# Altium footprint library HW_HOLLAND_NCDM_MONITOR_R1.PcbLib: 472 footprints (part 11 of 30)
Each footprint in its own frame and in the unit in brackets; x right, y up, seen from the top. Pads: shape width x height; smd on the part's side, far side on the other; paste and mask are expansions set on the pad; w line width, h text height; cw(c..) or ccw(c..) is an arc to the next point about the centre after c.
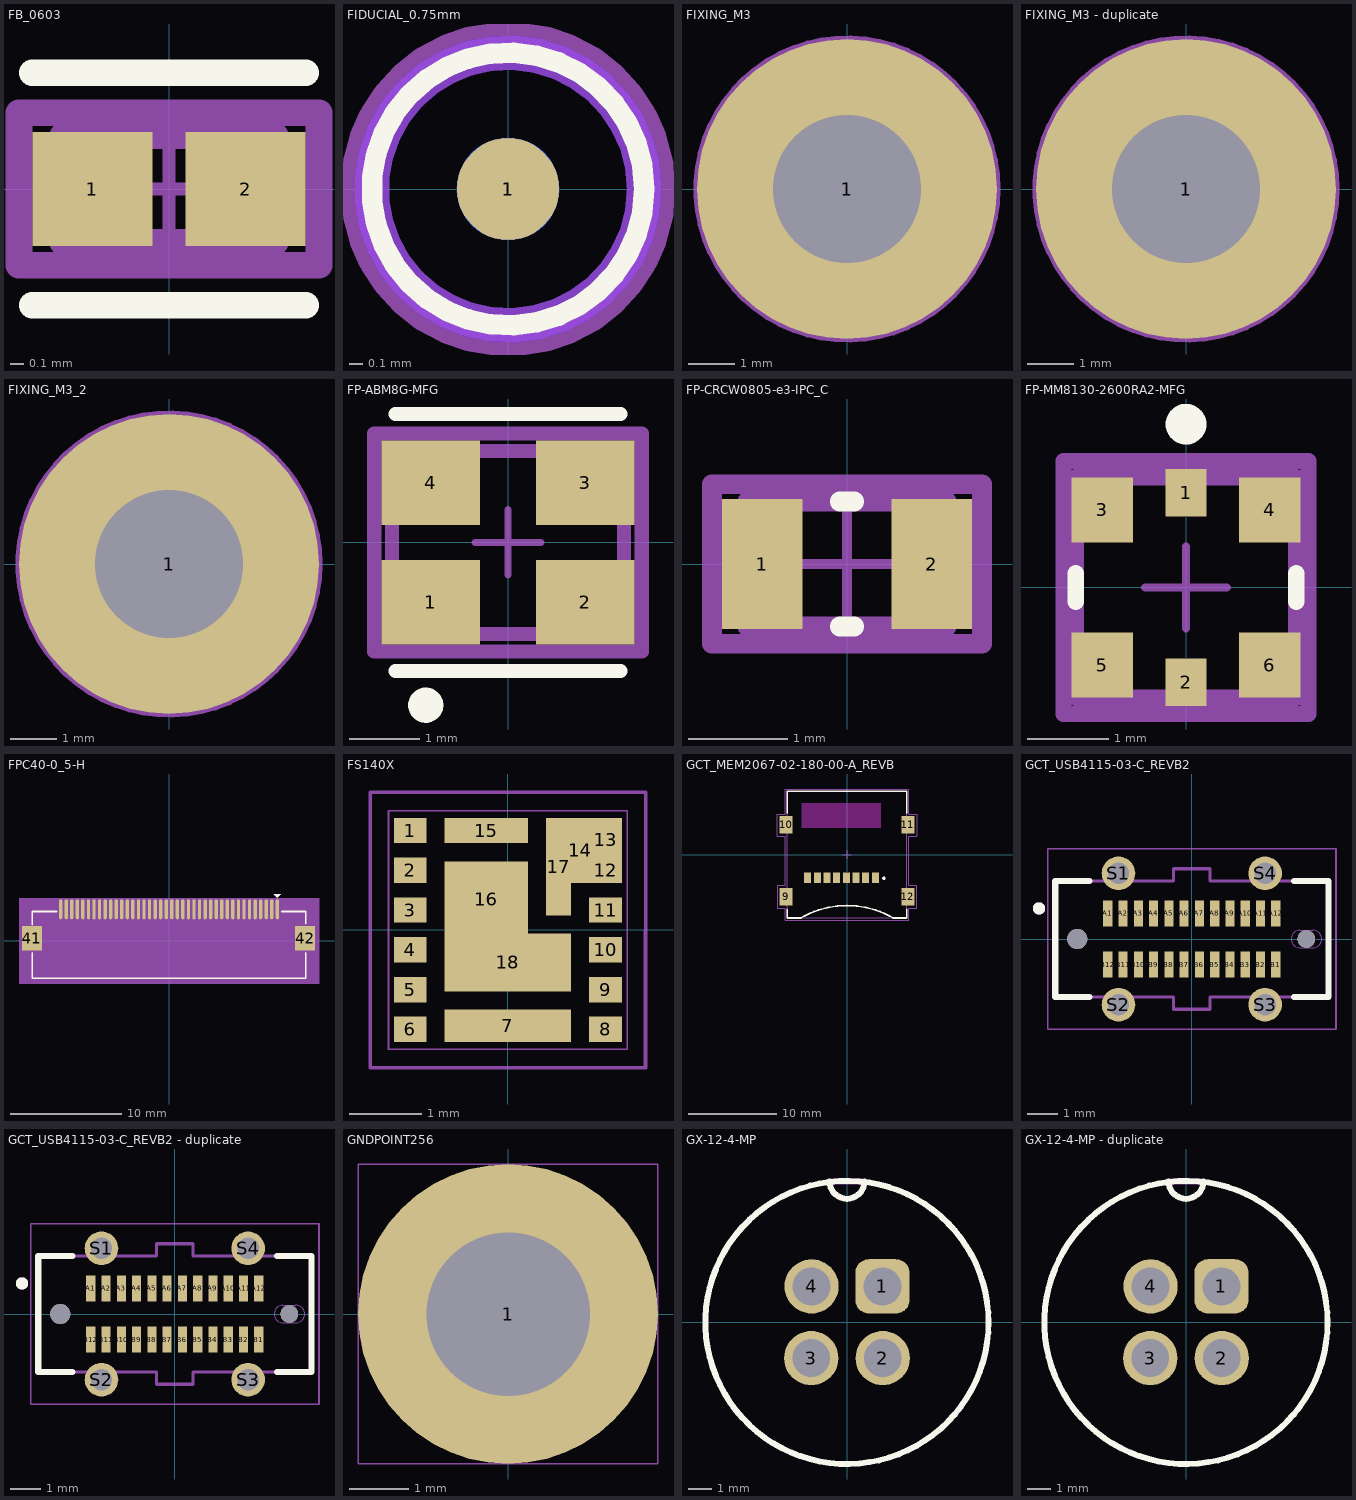
[diagram p10: the footprints below, top view; thin cyan lines are the x and y axes]

## FB_0603 [mm]
pads (2):
  rect 0.906x0.858 smd paste+0 mask+0: 1(-0.576,0) 2(0.576,0)
Top Overlay:
  lines w0.2: -1.029,-0.875 1.029,-0.875 ; -1.029,0.875 1.029,0.875
Top Courtyard:
  lines w0.2: -1.129,-0.575 1.129,-0.575 1.129,0.575 -1.129,0.575 -1.129,-0.575
  text ".Designator" at 0,0.235 h1.25
Mechanical 12:
  lines w0.2: -0.8,-0.4 0.8,-0.4 0.8,0.4 -0.8,0.4 -0.8,-0.4
Mechanical 15:
  lines w0.1: -0.5,0 0.5,0 ; 0,-0.5 0,0.5
  lines w0.2: -1.129,-0.575 1.129,-0.575 1.129,0.575 -1.129,0.575 -1.129,-0.575
3D body "FBead_Murata_BLM18SG331TN1D_eec.STEP": height 0.25, standoff 0, extent -1.129,-0.575 1.129,0.575

## FIDUCIAL_0.75mm [mm]
height 0.52
pads (2):
  round 0.75 smd mask+0.75: 1(0,0)
  round 0.75 smd far side mask+0.75: 1(0,0)
Top Layer keep-out:
  circle w0.254: c0,0 r1
Bottom Layer keep-out:
  circle w0.254: c0,0 r1
Top Overlay:
  circle w0.15: c0,0 r1
Bottom Overlay:
  circle w0.15: c0,0 r1
Top Designator:
  circle w0.254: c0,0 r1.1
  text ".Designator" at -3.809,-0.254 h0.76

## FIXING_M3 [mm]
height 0.52
pads (1):
  round 6.5 hole 3.2: 1(0,0)
Top Designator:
  circle w0.254: c0,0 r3.2
  text ".Designator" at -5.078,-0.339 h1.02

## FIXING_M3 - duplicate [mm]
height 0.52
pads (1):
  round 6.5 hole 3.2: 1(0,0)
Top Designator:
  circle w0.254: c0,0 r3.2
  text ".Designator" at -5.078,-0.339 h1.02

## FIXING_M3_2 [mm]
pads (1):
  round 6.5 hole 3.2: 1(0,0)
Top Designator:
  circle w0.254: c0,0 r3.2
  text ".Designator" at -5.078,-0.339 h1.02

## FP-ABM8G-MFG [mm]
height 1.1
pads (4):
  rect 1.4x1.2 smd paste+0 mask+0: 1(-1.1,-0.85) 2(1.1,-0.85) 3(1.1,0.85) 4(-1.1,0.85)
Top Overlay:
  circle w0.25: c-1.168,-2.311 r0.125
  lines w0.2: -1.6,-1.825 1.6,-1.825 ; -1.6,1.825 1.6,1.825
Top Assembly:
  lines w0.2: -1.9,-1.55 -1.9,1.55 1.9,1.55 1.9,-1.55 -1.9,-1.55
  text ".Designator" at 0,0.143 h0.76
Top 3D Body:
  lines w0.2: -1.65,-1.3 -1.65,1.3 1.65,1.3 1.65,-1.3 -1.65,-1.3
Top Component Center:
  lines w0.1: -0.465,0 0.465,0 ; 0,-0.465 0,0.465
Top Courtyard:
  lines w0.2: -1.9,-1.55 -1.9,1.55 1.9,1.55 1.9,-1.55 -1.9,-1.55
3D body "Crys_Abracon_ABM8G-25_000MHz-B4Y-T_eec.STEP": height 0.25, standoff 0, extent -1.9,-1.55 1.9,1.55

## FP-CRCW0805-e3-IPC_C [mil]
pads (2):
  rect 31.75x51.5 smd paste+0 mask+0: 1(-33.5,0) 2(33.5,0)
Top Overlay:
  lines w7.87: -2.86,-24.61 2.86,-24.61 ; -2.86,24.61 2.86,24.61
Top Assembly:
  lines w7.87: -53.31,-31.5 53.31,-31.5 53.31,31.5 -53.31,31.5 -53.31,-31.5
  text ".Designator" at 0,7.4 h39.37
Top 3D Body:
  lines w7.87: -39.37,-24.61 39.37,-24.61 39.37,24.61 -39.37,24.61 -39.37,-24.61
Top Component Center:
  lines w3.94: -19.68,0 19.68,0 ; 0,-19.68 0,19.68
Top Courtyard:
  lines w7.87: -53.31,-31.5 53.31,-31.5 53.31,31.5 -53.31,31.5 -53.31,-31.5
3D body "Res_Vishay_CRCW0805100KFKEA_eec.STEP": height 10, standoff 0, extent -53.31,-31.5 53.31,31.5

## FP-MM8130-2600RA2-MFG [mm]
pads (6):
  rect 0.5x0.58 smd paste-1000 mask+0: 1(0,1.16) 2(0,-1.16)
  rect 0.75x0.8 smd paste-1000 mask+0: 3(-1.025,0.95) 4(1.025,0.95) 5(-1.025,-0.95) 6(1.025,-0.95)
Top Overlay:
  circle w0.25: c0,2 r0.125
  lines w0.2: -1.35,-0.175 -1.35,0.175 ; 1.35,-0.175 1.35,0.175
Top Paste:
  rectangle: 0.65,-1.35 1.24,-0.55
  rectangle: -1.24,-1.35 -0.65,-0.55
  rectangle: 0.65,0.55 1.24,1.35
  rectangle: -1.24,0.55 -0.65,1.35
  rectangle: -0.139,-1.35 0.141,-1.07
  rectangle: -0.139,1.07 0.141,1.35
Top Assembly:
  lines w0.2: -1.5,-1.55 -1.5,1.55 1.5,1.55 1.5,-1.55 -1.5,-1.55
  text ".Designator" at 1.796,1.25 h0.8
Top 3D Body:
  lines w0.2: -1.35,-1.35 -1.35,1.35 1.35,1.35 1.35,-1.35 -1.35,-1.35
Top Component Center:
  lines w0.1: -0.5,0 0.5,0 ; 0,-0.5 0,0.5
Top Courtyard:
  lines w0.2: -1.5,-1.55 -1.5,1.55 1.5,1.55 1.5,-1.55 -1.5,-1.55
3D body "Conn_Murata_MM8130-2600RA2_eec.STEP": height 1.5, standoff 0, extent -1.25,-1.25 1.25,1.26

## FPC40-0_5-H [mm]
pads (42):
  oval 0.3x1.8 smd: 1(9.75,2.85) 2(9.25,2.85) 3(8.75,2.85) 4(8.25,2.85) 5(7.75,2.85) 6(7.25,2.85) 7(6.75,2.85) 8(6.25,2.85) 9(5.75,2.85) 10(5.25,2.85) 11(4.75,2.85) 12(4.25,2.85) 13(3.75,2.85) 14(3.25,2.85) 15(2.75,2.85) 16(2.25,2.85) 17(1.75,2.85) 18(1.25,2.85) 19(0.75,2.85) 20(0.25,2.85) 21(-0.25,2.85) 22(-0.75,2.85) 23(-1.25,2.85) 24(-1.75,2.85) 25(-2.25,2.85) 26(-2.75,2.85) 27(-3.25,2.85) 28(-3.75,2.85) 29(-4.25,2.85) 30(-4.75,2.85) 31(-5.25,2.85) 32(-5.75,2.85) 33(-6.25,2.85) 34(-6.75,2.85) 35(-7.25,2.85) 36(-7.75,2.85) 37(-8.25,2.85) 38(-8.75,2.85) 39(-9.25,2.85) 40(-9.75,2.85)
  rect 1.8x2.2 smd: 41(-12.35,0.229) 42(12.25,0.229)
Top Overlay:
  dashed: 9.449,4.201 10.049,4.201 9.749,3.901
  lines w0.152: -12.3,-1.05 -12.3,-3.35 12.3,-3.35 12.3,-1.05 ; -12.3,1.45 -12.3,2.65 -10.09,2.65 ; 10.15,2.65 12.3,2.65 12.3,1.55
  text ".Designator" at 0.635,0.212 h0.64
Top Assembly:
  dashed: 9.449,4.201 10.049,4.201 9.749,3.901
  lines w0.025: -12.294,-1.036 -12.294,-3.347 12.294,-3.347 12.294,-1.036 ; -12.294,1.428 -12.294,2.647 -10.084,2.647 ; 10.135,2.647 12.294,2.647 12.294,1.53
Top 3D Body:
  region: -13.5,3.85 13.5,3.85 13.5,-3.85 -13.5,-3.85
Mechanical 17:
  text "33" at -6.25,6.101 h2.03
  text "36" at -7.75,6.101 h2.03
  text "27" at -3.25,6.101 h2.03
  text "34" at -6.75,6.101 h2.03
  text "28" at -3.75,6.101 h2.03
  text "15" at 2.75,6.101 h2.03
  text "11" at 4.75,6.101 h2.03
  text "20" at 0.25,6.101 h2.03
  text "21" at -0.25,6.101 h2.03
  text "12" at 4.25,6.101 h2.03
  text "18" at 1.25,6.101 h2.03
  text "14" at 3.25,6.101 h2.03
  text "17" at 1.75,6.101 h2.03
  text "9" at 5.75,4.476 h2.03
  text "8" at 6.25,4.476 h2.03
  text "32" at -5.75,6.101 h2.03
  text "1" at 9.75,4.476 h2.03
  text "35" at -7.25,6.101 h2.03
  text "37" at -8.25,6.101 h2.03
  text "38" at -8.75,6.101 h2.03
  text "39" at -9.25,6.101 h2.03
  text "40" at -9.75,6.101 h2.03
  text "4" at 8.25,4.476 h2.03
  text "5" at 7.75,4.476 h2.03
  text "6" at 7.25,4.476 h2.03
  text "23" at -1.25,6.101 h2.03
  text "24" at -1.75,6.101 h2.03
  text "26" at -2.75,6.101 h2.03
  text "29" at -4.25,6.101 h2.03
  text "31" at -5.25,6.101 h2.03
  text "42" at 12.25,3.481 h2.03
  text "7" at 6.75,4.476 h2.03
  text "10" at 5.25,6.101 h2.03
  text "13" at 3.75,6.101 h2.03
  text "16" at 2.25,6.101 h2.03
  text "22" at -0.75,6.101 h2.03
  text "25" at -2.25,6.101 h2.03
  text "19" at 0.75,6.101 h2.03
  text "30" at -4.75,6.101 h2.03
  text "41" at -12.35,3.481 h2.03
  text "3" at 8.75,4.476 h2.03
  text "2" at 9.25,4.476 h2.03
3D body: height 3.81, standoff 0, extent -13.5,-3.85 13.5,3.85

## FS140X [mm]
pads (18):
  rect 0.45x0.35 smd: 1(-1.35,1.375) 2(-1.35,0.825) 3(-1.35,0.275) 4(-1.35,-0.275) 5(-1.35,-0.825) 6(-1.35,-1.375) 8(1.35,-1.375) 9(1.35,-0.825) 10(1.35,-0.275) 11(1.35,0.275) 12(1.35,0.825)
  rect 1.75x0.45 smd: 7(0,-1.325)
  rect 0.45x0.6 smd: 13(1.35,1.25)
  rect 0.35x0.9 smd: 14(1,1.1)
  rect 1.15x0.35 smd: 15(-0.3,1.375)
  rect 1.15x1.05 smd: 16(-0.3,0.425)
  rect 0.35x1.35 smd: 17(0.7,0.875)
  rect 1.75x0.8 smd: 18(0,-0.45)
Mechanical 13:
  lines w0.025: -1.65,-1.65 1.65,-1.65 1.65,1.65 -1.65,1.65 -1.65,-1.65
Mechanical 15:
  lines w0.05: -1.904,-1.904 -1.904,1.904 1.906,1.904 1.904,-1.904 -1.904,-1.904
3D body "FS1403-3300-AL.stp": height 1.42, standoff -0.03, extent -1.652,-1.65 1.648,1.65

## GCT_MEM2067-02-180-00-A_REVB [mm]
pads (12):
  rect 0.8x1.2 smd: 1(3.225,-2.625) 2(2.125,-2.625) 3(1.025,-2.625) 4(-0.075,-2.625) 5(-1.175,-2.625) 6(-2.275,-2.625) 7(-3.375,-2.625) 8(-4.475,-2.625)
  rect 1.5x2 smd: 9(-6.945,-4.825) 10(-6.945,3.375) 11(6.945,3.375) 12(6.945,-4.825)
Top Overlay:
  circle w0.2: c4.2,-2.7 r0.1
  lines w0.2: -6.8,-6.275 -6.8,-7.225 -5.25,-7.225 ; -6.8,4.725 -6.8,7.225 6.8,7.225 6.8,4.725 ; -5.226,-7.211 cw(c0,-16.264) 5.226,-7.211 ; 5.25,-7.225 6.8,-7.225 6.8,-6.275
Keep-Out Layer:
  region: 3.85,3.028 -5.155,3.028 -5.155,5.825 3.85,5.825
Mechanical 13:
  lines w0.1: -6.8,2.77 -7.3,2.77 -7.3,3.97 -6.8,3.97 ; -0.5,0 0.5,0 ; 0,-0.5 0,0.5 ; -6.8,-5.4 -7.3,-5.4 -7.3,-4.2 -6.8,-4.2 ; -6.8,-5.4 -6.8,-4.2 ; -6.8,-5.4 -6.8,-7.225 6.8,-7.225 6.8,-5.4 ; -6.8,-4.2 -6.8,7.225 6.8,7.225 6.8,3.97 ; 6.8,-5.4 6.8,-4.2 ; 6.8,-5.4 7.3,-5.4 7.3,-4.2 6.8,-4.2 ; 6.8,-4.2 6.8,2.77 ; 6.8,2.77 6.8,3.97 ; 6.8,2.77 7.3,2.77 7.3,3.97 6.8,3.97
Mechanical 15:
  lines w0.05: -7.95,-6.096 -7.061,-6.096 -7.061,-7.468 7.061,-7.468 7.061,-6.096 7.95,-6.096 7.95,-3.505 7.061,-3.505 7.061,2.108 7.95,2.108 7.95,4.597 7.061,4.597 7.061,7.468 -7.061,7.468 -7.061,4.597 -7.95,4.597 -7.95,2.108 -7.061,2.108 -7.061,-3.505 -7.95,-3.505 -7.95,-6.096
3D body "MEM2067-02-180-00-A--3DModel-STEP-56544.STEP": height 1.8, standoff 0, extent -7.427,-7.225 7.173,7.225

## GCT_USB4115-03-C_REVB2 [mm]
pads (30):
  rect 0.3x0.85 smd: A1(-2.75,0.835) A2(-2.25,0.835) A3(-1.75,0.835) A4(-1.25,0.835) A5(-0.75,0.835) A6(-0.25,0.835) A7(0.25,0.835) A8(0.75,0.835) A9(1.25,0.835) A10(1.75,0.835) A11(2.25,0.835) A12(2.75,0.835) B1(2.75,-0.835) B2(2.25,-0.835) B3(1.75,-0.835) B4(1.25,-0.835) B5(0.75,-0.835) B6(0.25,-0.835) B7(-0.25,-0.835) B8(-0.75,-0.835) B9(-1.25,-0.835) B10(-1.75,-0.835) B11(-2.25,-0.835) B12(-2.75,-0.835)
  round 1.1 hole 0.7: S1(-2.4,2.15) S2(-2.4,-2.15) S3(2.4,-2.15) S4(2.4,2.15)
  round 0.66 hole 0.66 unplated: ""(-3.75,0)
  round 0.58 hole 0.58 unplated: ""(3.75,0)
Top Overlay:
  circle w0.2: c-5,1 r0.1
  lines w0.2: -3.35,-1.9 -4.47,-1.9 -4.47,1.9 -3.35,1.9 ; 3.35,-1.9 4.47,-1.9 4.47,1.9 3.35,1.9
Mechanical 1:
  lines w0: 3.25,0 cw(c3.54,0) 3.54,0.29 3.96,0.29 cw(c3.96,0) 4.25,0 cw(c3.96,0) 3.96,-0.29 3.54,-0.29 cw(c3.54,0) 3.25,0
Mechanical 13:
  circle w0.2: c-5,1 r0.1
  lines w0.1: -4.47,-1.9 -0.6,-1.9 -0.6,-2.3 0.6,-2.3 0.6,-1.9 4.47,-1.9 4.47,1.9 0.6,1.9 0.6,2.3 -0.6,2.3 -0.6,1.9 -4.47,1.9 -4.47,-1.9
Mechanical 15:
  lines w0.05: -4.72,-2.95 -4.72,2.95 4.72,2.95 4.72,-2.95 -4.72,-2.95
3D body "step_temp.STEP": height 9.25, standoff -1.15, extent -4.47,-2.3 4.47,2.3

## GCT_USB4115-03-C_REVB2 - duplicate [mm]
pads (30):
  rect 0.3x0.85 smd: A1(-2.75,0.835) A2(-2.25,0.835) A3(-1.75,0.835) A4(-1.25,0.835) A5(-0.75,0.835) A6(-0.25,0.835) A7(0.25,0.835) A8(0.75,0.835) A9(1.25,0.835) A10(1.75,0.835) A11(2.25,0.835) A12(2.75,0.835) B1(2.75,-0.835) B2(2.25,-0.835) B3(1.75,-0.835) B4(1.25,-0.835) B5(0.75,-0.835) B6(0.25,-0.835) B7(-0.25,-0.835) B8(-0.75,-0.835) B9(-1.25,-0.835) B10(-1.75,-0.835) B11(-2.25,-0.835) B12(-2.75,-0.835)
  round 1.1 hole 0.7: S1(-2.4,2.15) S2(-2.4,-2.15) S3(2.4,-2.15) S4(2.4,2.15)
  round 0.66 hole 0.66 unplated: ""(-3.75,0)
  round 0.58 hole 0.58 unplated: ""(3.75,0)
Top Overlay:
  circle w0.2: c-5,1 r0.1
  lines w0.2: -3.35,-1.9 -4.47,-1.9 -4.47,1.9 -3.35,1.9 ; 3.35,-1.9 4.47,-1.9 4.47,1.9 3.35,1.9
Mechanical 1:
  lines w0: 3.25,0 cw(c3.54,0) 3.54,0.29 3.96,0.29 cw(c3.96,0) 4.25,0 cw(c3.96,0) 3.96,-0.29 3.54,-0.29 cw(c3.54,0) 3.25,0
Mechanical 13:
  circle w0.2: c-5,1 r0.1
  lines w0.1: -4.47,-1.9 -0.6,-1.9 -0.6,-2.3 0.6,-2.3 0.6,-1.9 4.47,-1.9 4.47,1.9 0.6,1.9 0.6,2.3 -0.6,2.3 -0.6,1.9 -4.47,1.9 -4.47,-1.9
Mechanical 15:
  lines w0.05: -4.72,-2.95 -4.72,2.95 4.72,2.95 4.72,-2.95 -4.72,-2.95
3D body "step_temp.STEP": height 9.25, standoff -1.15, extent -4.47,-2.3 4.47,2.3

## GNDPOINT256 [mil]
pads (1):
  round 200 hole 109: 1(0,0)
Top Overlay:
  text ".Designator" at -62.52,-8.34 h25
Top 3D Body:
  lines w1: -100,-100 100,-100 100,100 -100,100 -100,-100
Top Component Center:
  lines w1: -10,0 10,0 ; 0,-10 0,10
Top Courtyard:
  lines w1: -100,-100 100,-100 100,100 -100,100 -100,-100
Mechanical 17:
  text "1" at -128,0 h160
Mechanical 21:
  text "PAD C200-109T" at -172,-198 h60
  text "GNDPOINT256" at -145,236 h60

## GX-12-4-MP [mm]
pads (4):
  rrect50% 2.3x2.3 hole 1.6: 1(1.501,1.526)
  round 2.3 hole 1.6: 2(1.513,-1.513) 3(-1.513,-1.513) 4(-1.501,1.526)
Top Overlay:
  circle w0.254: c0,0 r6
  lines w0.254: -0.737,5.969 ccw(c0,5.975) 0.737,5.969
Mechanical 1:
  lines w0.254: -0.737,5.963 0.737,5.963
3D body "GX12-4P v3.step": height 16.6, standoff -4.1, extent -8.35,-7.397 8.35,7.4

## GX-12-4-MP - duplicate [mm]
pads (4):
  rrect50% 2.3x2.3 hole 1.6: 1(1.501,1.526)
  round 2.3 hole 1.6: 2(1.513,-1.513) 3(-1.513,-1.513) 4(-1.501,1.526)
Top Overlay:
  circle w0.254: c0,0 r6
  lines w0.254: -0.737,5.969 ccw(c0,5.975) 0.737,5.969
Mechanical 1:
  lines w0.254: -0.737,5.963 0.737,5.963
3D body "GX12-4P v3.step": height 16.6, standoff -4.1, extent -8.35,-7.397 8.35,7.4